# Altium footprint library alex_footprint.PcbLib: 262 footprints (part 1 of 17)
Each footprint in its own frame and in the unit in brackets; x right, y up, seen from the top. Pads: shape width x height; smd on the part's side, far side on the other; paste and mask are expansions set on the pad; w line width, h text height; cw(c..) or ccw(c..) is an arc to the next point about the centre after c.
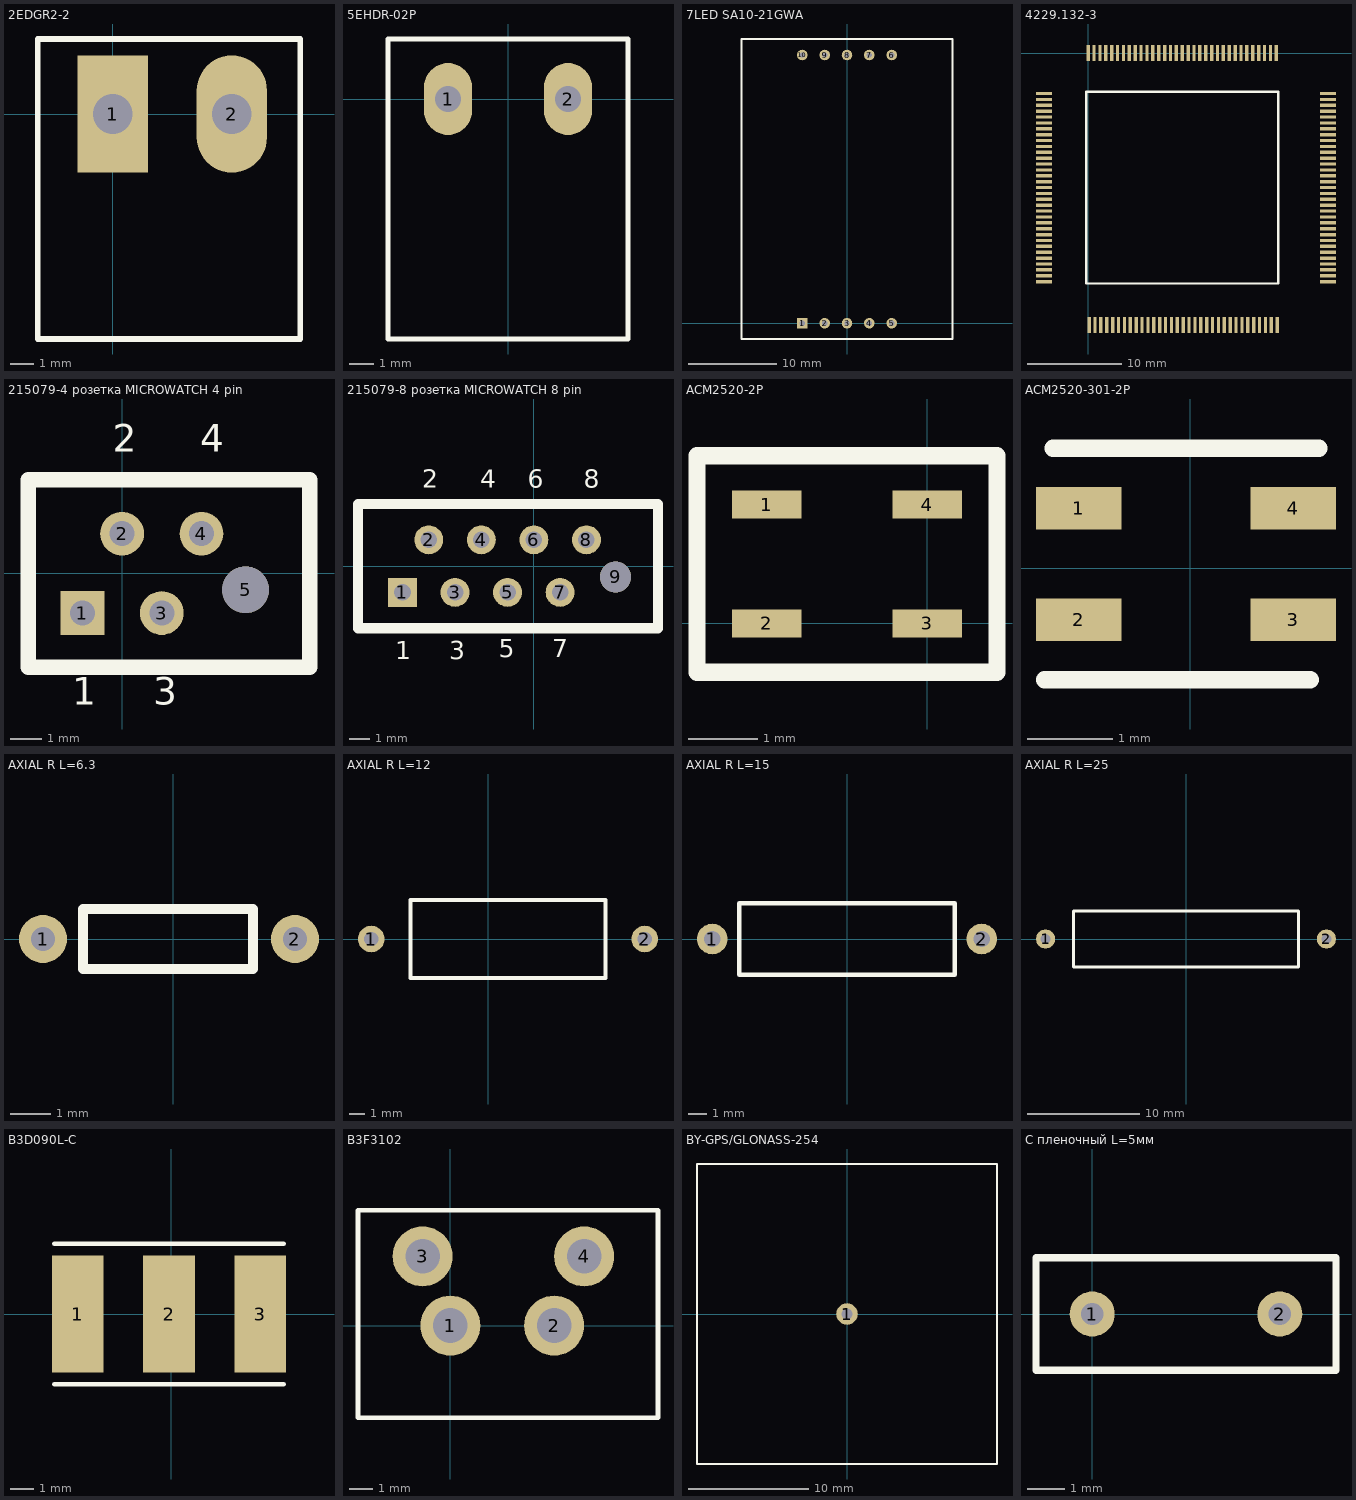
[diagram p0: the footprints below, top view; thin cyan lines are the x and y axes]

## 2EDGR2-2 [mm]
height 8.2
pads (2):
  rect 3x5 hole 1.7 unplated: 1(0,0)
  oval 3x5 hole 1.7 unplated: 2(5.08,0)
Top Overlay:
  lines w0.254: -3.2,-9.6 8,-9.6 8,3.2 -3.2,3.2 -3.2,-9.6

## 5EHDR-02P [mm]
pads (2):
  oval 2x3 hole 1.1 unplated mask+0.25: 1(-2.5,0) 2(2.5,0)
Top Overlay:
  lines w0.2: -5,-10 5,-10 5,2.5 -5,2.5 -5,-2.5 -5,-10

## 7LED SA10-21GWA [mm]
pads (10):
  rect 1.2x1.2 hole 0.6 unplated: 1(-5.08,0)
  round 1.2 hole 0.6 unplated: 2(-2.54,0) 3(0,0) 4(2.54,0) 5(5.08,0) 6(5.08,30.48) 7(2.54,30.48) 8(0,30.48) 9(-2.54,30.48) 10(-5.08,30.48)
Top Overlay:
  lines w0.25: -12,-1.8 -12,32.3 12,32.3 12,-1.8 -12,-1.8

## 4229.132-3 [mm]
pads (132):
  rect 0.35x1.7 smd: 1(0,0) 1(20.1,-28.9) 2(0.625,0) 2(19.475,-28.9) 3(1.25,0) 3(18.85,-28.9) 4(1.875,0) 4(18.225,-28.9) 5(2.5,0) 5(17.6,-28.9) 6(3.125,0) 6(16.975,-28.9) 7(3.75,0) 7(16.35,-28.9) 8(4.375,0) 8(15.725,-28.9) 9(5,0) 9(15.1,-28.9) 10(5.625,0) 10(14.475,-28.9) 11(6.25,0) 11(13.85,-28.9) 12(6.875,0) 12(13.225,-28.9) 13(7.5,0) 13(12.6,-28.9) 14(8.125,0) 14(11.975,-28.9) 15(8.75,0) 15(11.35,-28.9) 16(9.375,0) 16(10.725,-28.9) 17(10,0) 17(10.1,-28.9) 18(9.475,-28.9) 18(10.625,0) 19(8.85,-28.9) 19(11.25,0) 20(8.225,-28.9) 20(11.875,0) 21(7.6,-28.9) 21(12.5,0) 22(6.975,-28.9) 22(13.125,0) 23(6.35,-28.9) 23(13.75,0) 24(5.725,-28.9) 24(14.375,0) 25(5.1,-28.9) 25(15,0) 26(4.475,-28.9) 26(15.625,0) 27(3.85,-28.9) 27(16.25,0) 28(3.225,-28.9) 28(16.875,0) 29(2.6,-28.9) 29(17.5,0) 30(1.975,-28.9) 30(18.125,0) 31(1.35,-28.9) 31(18.75,0) 32(0.725,-28.9) 32(19.375,0) 33(0.1,-28.9) 33(20,0)
  rect 1.7x0.35 smd: 1(25.5,-4.3) 2(25.5,-4.925) 3(25.5,-5.55) 4(25.5,-6.175) 5(25.5,-6.8) 6(25.5,-7.425) 7(25.5,-8.05) 8(25.5,-8.675) 9(25.5,-9.3) 10(-4.7,-18.675) 10(25.5,-9.925) 11(-4.7,-18.05) 11(25.5,-10.55) 12(-4.7,-17.425) 12(25.5,-11.175) 13(-4.7,-16.8) 13(25.5,-11.8) 14(-4.7,-16.175) 14(25.5,-12.425) 15(-4.7,-15.55) 15(25.5,-13.05) 16(-4.7,-14.925) 16(25.5,-13.675) 17(-4.7,-14.3) 17(25.5,-14.3) 18(-4.7,-13.675) 18(25.5,-14.925) 19(-4.7,-13.05) 19(25.5,-15.55) 20(-4.7,-12.425) 20(25.5,-16.175) 21(-4.7,-11.8) 21(25.5,-16.8) 22(-4.7,-11.175) 22(25.5,-17.425) 23(-4.7,-10.55) 23(25.5,-18.05) 24(-4.7,-9.925) 24(25.5,-18.675) 25(-4.7,-9.3) 25(25.5,-19.3) 26(-4.7,-8.675) 26(25.5,-19.925) 27(-4.7,-8.05) 27(25.5,-20.55) 28(-4.7,-7.425) 28(25.5,-21.175) 29(-4.7,-6.8) 29(25.5,-21.8) 30(-4.7,-6.175) 30(25.5,-22.425) 31(-4.7,-5.55) 31(25.5,-23.05) 32(-4.7,-4.925) 32(25.5,-23.675) 33(-4.7,-4.3) 33(25.5,-24.3) 34(-4.7,-24.3) 35(-4.7,-23.675) 36(-4.7,-23.05) 37(-4.7,-22.425) 38(-4.7,-21.8) 39(-4.7,-21.175) 40(-4.7,-20.55) 41(-4.7,-19.925) 42(-4.7,-19.3)
Top Overlay:
  lines w0.254: -0.2,-24.5 -0.2,-4.1 20.2,-4.1 20.2,-24.5 -0.2,-24.5

## 215079-4 розетка MICROWATCH 4 pin [mm]
pads (5):
  rect 1.4x1.4 hole 0.8 unplated mask+0.2: 1(-1.27,-1.27)
  round 1.4 hole 0.8 unplated mask+0.2: 2(0,1.27) 3(1.27,-1.27) 4(2.54,1.27)
  round 1.5 hole 1.5 unplated mask+0.2: 5(3.95,-0.525)
Top Overlay:
  lines w0.5: -3,-3 6,-3 6,3 -3,3 -3,-3
  text "1" at -1.6,-4.5 h1.5
  text "3" at 1,-4.5 h1.5
  text "2" at -0.3,3.6 h1.5
  text "4" at 2.5,3.6 h1.5
Bottom Overlay:
  text "1" at -1.1,-3.4 h1.5
  text "2" at 0.2,2.3 h1.5
  text "4" at 2.8,2.3 h1.5
  text "3" at 1.7,-3.3 h1.5

## 215079-8 розетка MICROWATCH 8 pin [mm]
pads (9):
  rect 1.4x1.4 hole 0.8 unplated paste+0.4 mask+0.2: 1(-6.35,-1.27)
  round 1.4 hole 0.8 unplated mask+0.2: 2(-5.08,1.27) 3(-3.81,-1.27) 4(-2.54,1.27) 5(-1.27,-1.27) 6(0,1.27) 7(1.27,-1.27) 8(2.54,1.27)
  round 1.5 hole 1.5 unplated mask+0.2: 9(3.95,-0.525)
Top Overlay:
  lines w0.5: -8.5,-3 -8.5,3 6,3 6,-3 -8.5,-3
  text "8" at 2.4,3.5 h1.5
  text "7" at 0.9,-4.7 h1.5
  text "6" at -0.3,3.5 h1.5
  text "5" at -1.7,-4.7 h1.5
  text "4" at -2.6,3.5 h1.5
  text "2" at -5.4,3.5 h1.5
  text "3" at -4.1,-4.8 h1.5
  text "1" at -6.7,-4.8 h1.5
Bottom Overlay:
  text "8" at 2.6,2.4 h1.5
  text "7" at 1.5,-3.3 h1.5
  text "6" at 0.3,2.3 h1.5
  text "5" at -0.8,-3.3 h1.5
  text "3" at -3.4,-3.3 h1.5
  text "4" at -2.1,2.3 h1.5
  text "2" at -4.7,2.3 h1.5
  text "1" at -6.2,-3.4 h1.5

## ACM2520-2P [mm]
pads (4):
  rect 1x0.4 smd: 1(-2.3,1.7) 2(-2.3,0) 3(0,0) 4(0,1.7)
Top Overlay:
  lines w0.25: -3.3,-0.7 -3.3,2.4 1,2.4 1,-0.7 -3.3,-0.7

## ACM2520-301-2P [mm]
pads (4):
  rect 1x0.5 smd mask+0.25: 1(-1.3,0.7) 2(-1.3,-0.6) 3(1.2,-0.6) 4(1.2,0.7)
Top Overlay:
  lines w0.2: -1.7,-1.3 1.4,-1.3 ; -1.6,1.4 1.5,1.4

## AXIAL R L=6.3 [mm]
height 6
pads (2):
  round 1.2 hole 0.6 unplated: 1(-3.25,0) 2(3.05,0)
Top Overlay:
  lines w0.254: -2.25,-0.75 2,-0.75 2,0.75 -2.25,0.75 -2.25,-0.75

## AXIAL R L=12 [mm]
height 6
pads (2):
  round 1.7 hole 0.9 unplated: 1(-7.5,0) 2(10,0)
Top Overlay:
  lines w0.254: -5,-2.5 7.5,-2.5 7.5,0 7.5,2.5 -5,2.5 -5,-2.5

## AXIAL R L=15 [mm]
height 6
pads (2):
  round 1.7 hole 0.9 unplated: 1(-7.5,0) 2(7.5,0)
Top Overlay:
  lines w0.254: -6,-2 6,-2 6,0 6,2 -6,2 -6,-2

## AXIAL R L=25 [mm]
height 6
pads (2):
  round 1.7 hole 0.9 unplated: 1(-12.5,0) 2(12.5,0)
Top Overlay:
  lines w0.254: -10,-2.5 -10,2.5 10,2.5 10,0 10,-2.5 -10,-2.5

## B3D090L-C [mm]
pads (3):
  rect 2.2x5 smd mask+0.25: 1(-4,0) 2(-0.1,0) 3(3.8,0)
Top Overlay:
  lines w0.2: -5,-3 4.8,-3 ; -5,3 4.8,3

## B3F3102 [mm]
pads (4):
  round 2.6 hole 1.5 unplated: 1(0,0) 2(4.5,0) 3(-1.2,3) 4(5.8,3)
Top Overlay:
  lines w0.2: -4,-4 9,-4 9,5 -4,5 -4,-4

## BY-GPS/GLONASS-254 [mm]
pads (1):
  round 1.8 hole 0.9 unplated: 1(0,0)
Top Overlay:
  lines w0.2: -12.5,-12.5 -12.5,12.5 12.5,12.5 12.5,-12.5 -12.5,-12.5

## C пленочный L=5мм [mm]
pads (2):
  round 1.2 hole 0.6: 1(0,0) 2(5,0)
Top Overlay:
  lines w0.2: -1.5,-1.5 -1.5,1.5 0,1.5 6.5,1.5 6.5,-1.5 -1.5,-1.5